# Altium footprint library PcbLib.PcbLib: 428 footprints (part 11 of 27)
Each footprint in its own frame and in the unit in brackets; x right, y up, seen from the top. Pads: shape width x height; smd on the part's side, far side on the other; paste and mask are expansions set on the pad; w line width, h text height; cw(c..) or ccw(c..) is an arc to the next point about the centre after c.
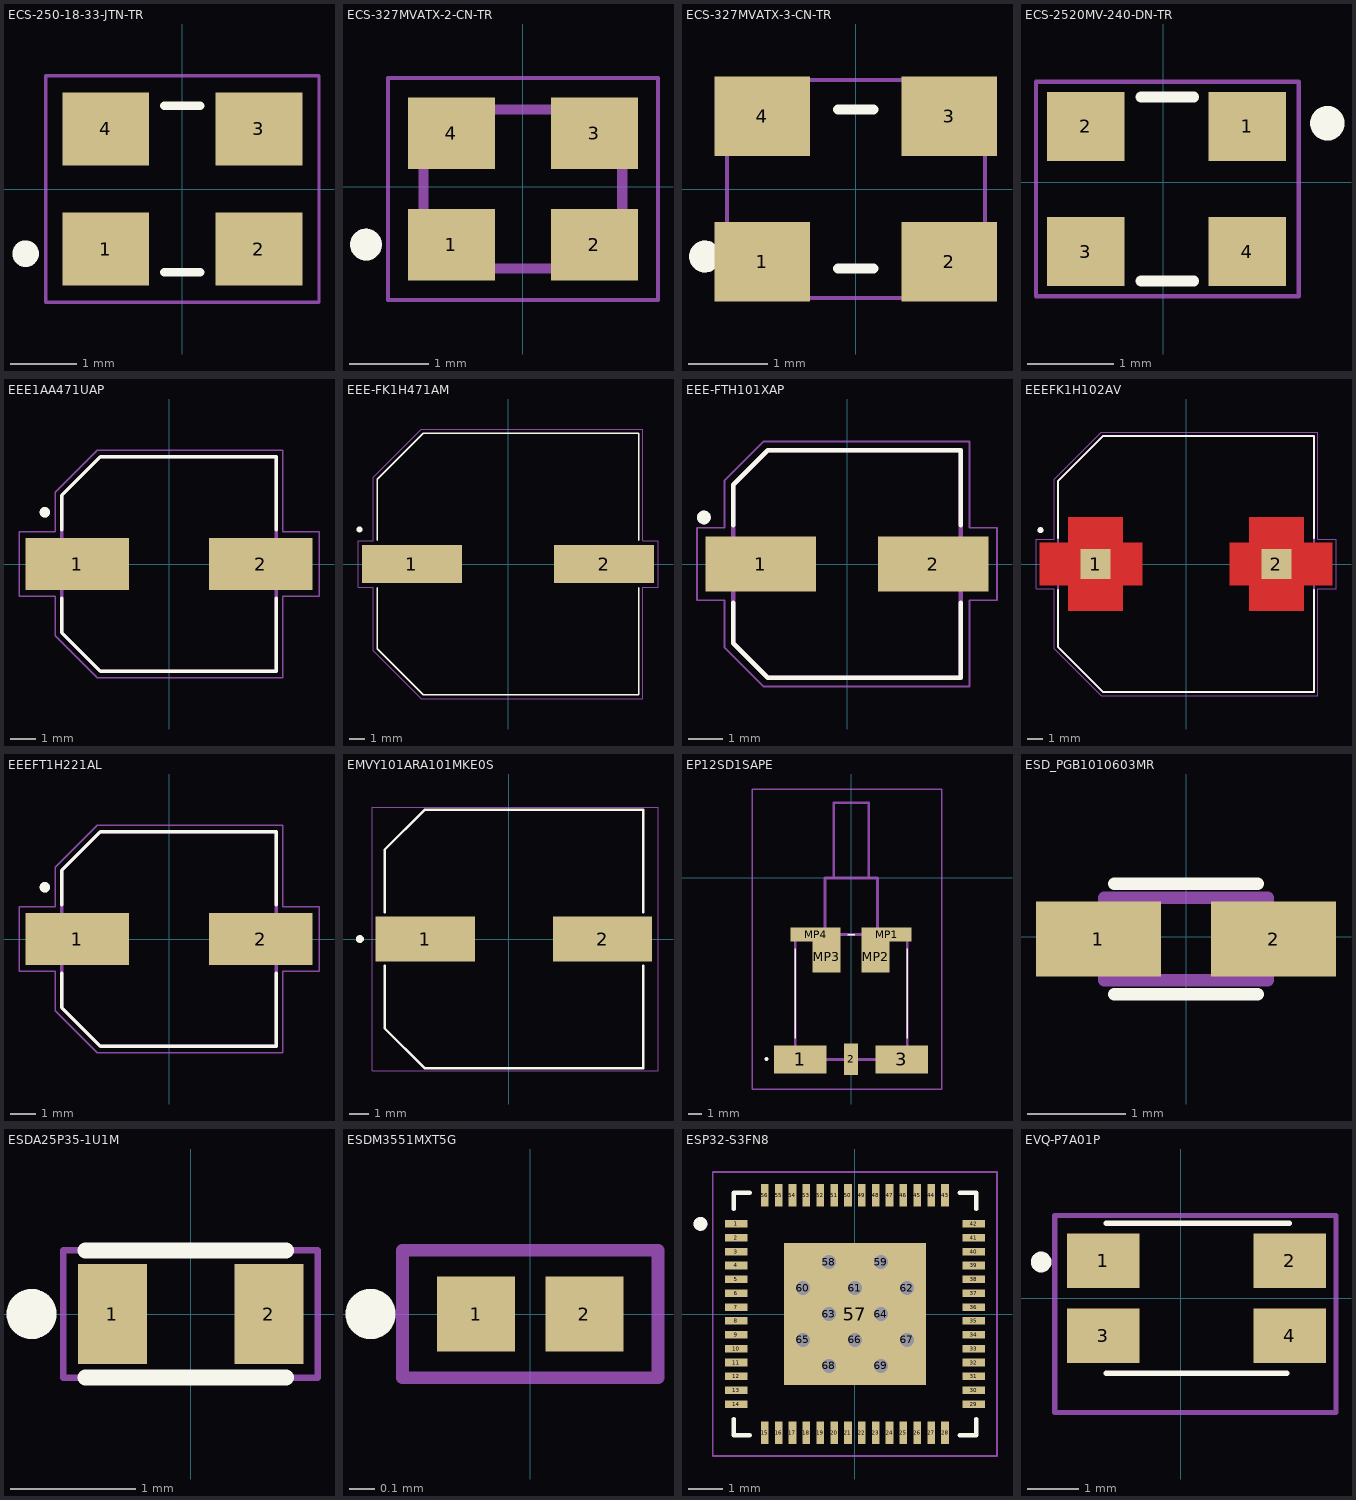
[diagram p10: the footprints below, top view; thin cyan lines are the x and y axes]

## ECS-250-18-33-JTN-TR [mm]
pads (4):
  rect 1.3x1.1 smd: 1(-1.15,-0.9) 2(1.15,-0.9) 3(1.15,0.9) 4(-1.15,0.9)
Top Overlay:
  circle w0.2: c-2.35,-0.97 r0.1
  lines w0.127: -0.27,-1.25 0.27,-1.25 ; -0.27,1.25 0.27,1.25
Mechanical 15:
  lines w0.05: -2.05,-1.7 2.05,-1.7 2.05,1.7 -2.05,1.7 -2.05,-1.7
3D body "step_temp.STEP": height 0.8, standoff 0, extent -1.6,-1.25 1.6,1.25

## ECS-327MVATX-2-CN-TR [mm]
pads (4):
  rect 1.1x0.9 smd: 1(-0.9,-0.725) 2(0.9,-0.725) 3(0.9,0.675) 4(-0.9,0.675)
Top Overlay:
  circle w0.2: c-1.977,-0.725 r0.1
Mechanical 13:
  circle w0.2: c-1.977,-0.725 r0.1
  lines w0.127: -1.25,-1.025 -1.25,0.975 1.25,0.975 1.25,-1.025 -1.25,-1.025
Mechanical 15:
  lines w0.05: -1.7,-1.425 -1.7,1.375 1.7,1.375 1.7,-1.425 -1.7,-1.425
3D body "ECS-2033-120-BN.STEP": height 1, standoff 0, extent -1.225,-1.025 1.275,0.975

## ECS-327MVATX-3-CN-TR [mm]
pads (4):
  rect 1.2x1 smd: 1(-1.179,-0.915) 2(1.179,-0.915) 3(1.179,0.915) 4(-1.179,0.915)
Top Overlay:
  circle w0.2: c-1.9,-0.85 r0.1
  lines w0.127: -0.221,-1 0.221,-1 ; -0.221,1 0.221,1
Mechanical 13:
  circle w0.2: c-1.9,-0.85 r0.1
Mechanical 15:
  lines w0.05: -1.625,-1.375 1.625,-1.375 1.625,1.375 -1.625,1.375 -1.625,-1.375
3D body "step_temp.STEP": height 1.2, standoff 0, extent -1.6,-1.25 1.6,1.25

## ECS-2520MV-240-DN-TR [mm]
height 0.8
pads (4):
  rect 0.9x0.8 smd: 1(0.974,0.649) 2(-0.898,0.649) 3(-0.898,-0.801) 4(0.974,-0.801)
Top Overlay:
  circle w0.2: c1.905,0.686 r0.1
  lines w0.127: -0.254,-1.143 0.356,-1.143 ; -0.254,0.991 0.356,0.991
Mechanical 15:
  lines w0.05: -1.473,-1.321 1.575,-1.321 1.575,1.168 -1.473,1.168 -1.473,-1.321
3D body "ASVTX-12-A-16.368MHZ-I15-T--3DModel-STEP-368357.STEP": height 0.95, standoff 0.05, extent -1.199,-1.076 1.301,0.924

## EEE1AA471UAP [mm]
pads (2):
  rect 4x2 smd: 1(-3.55,0) 2(3.55,0)
Top Overlay:
  circle w0.2: c-4.8,2 r0.1
  lines w0.127: -4.15,-1.32 -4.15,-2.65 -2.65,-4.15 4.15,-4.15 4.15,-1.32 ; -4.15,1.32 -4.15,2.65 -2.65,4.15 4.15,4.15 4.15,1.32
Mechanical 13:
  circle w0.2: c-4.8,2 r0.1
  lines w0.127: -4.15,-2.65 -4.15,2.65 -2.65,4.15 4.15,4.15 4.15,-4.15 -2.65,-4.15 -4.15,-2.65
Mechanical 15:
  lines w0.05: -5.8,-1.25 -4.4,-1.25 -4.4,-2.775 -2.775,-4.4 4.4,-4.4 4.4,-1.25 5.8,-1.25 5.8,1.25 4.4,1.25 4.4,4.4 -2.775,4.4 -4.4,2.775 -4.4,1.25 -5.8,1.25 -5.8,-1.25
3D body "step_temp.STEP": height 10.2, standoff 0, extent -4.85,-4.15 4.85,4.15

## EEE-FK1H471AM [mm] "EEE-FK1H471AM"
pads (2):
  rect 6.5x2.5 smd: 1(-6.25,0) 2(6.25,0)
Top Overlay:
  circle w0.2: c-9.65,2.25 r0.1
  lines w0.127: -8.5,-1.57 -8.5,-5.5 -5.5,-8.5 8.5,-8.5 8.5,-1.57 ; -8.5,1.57 -8.5,5.5 -5.5,8.5 8.5,8.5 8.5,1.57
Mechanical 15:
  lines w0.05: -9.75,-1.5 -9.75,1.5 -8.75,1.5 -8.75,5.625 -5.625,8.75 8.75,8.75 8.75,1.5 9.75,1.5 9.75,-1.5 8.75,-1.5 8.75,-8.75 -5.625,-8.75 -8.75,-5.625 -8.75,-1.5 -9.75,-1.5
3D body "step_temp.STEP": height 16.5, standoff 0, extent -9.2,-8.5 9.2,8.5

## EEE-FTH101XAP [mm]
pads (2):
  rect 3.2x1.6 smd: 1(-2.5,0) 2(2.5,0)
Top Overlay:
  circle w0.2: c-4.15,1.35 r0.1
  lines w0.127: -3.3,-1.12 -3.3,-2.3 -2.3,-3.3 3.3,-3.3 3.3,-1.12 ; -3.3,1.12 -3.3,2.3 -2.3,3.3 3.3,3.3 3.3,1.12
Mechanical 13:
  circle w0.2: c-4.15,1.35 r0.1
  lines w0.127: -3.3,-2.3 -2.3,-3.3 3.3,-3.3 3.3,3.3 -2.3,3.3 -3.3,2.3 -3.3,-2.3
Mechanical 15:
  lines w0.05: -4.35,-1.05 -4.35,1.05 -3.55,1.05 -3.55,2.425 -2.425,3.55 3.55,3.55 3.55,1.05 4.35,1.05 4.35,-1.05 3.55,-1.05 3.55,-3.55 -2.425,-3.55 -3.55,-2.425 -3.55,-1.05 -4.35,-1.05
3D body "step_temp.STEP": height 0, standoff 0, extent 0,0 0,0
3D body "EEE-FTH101XAP.STEP": height 7.7, standoff 0, extent -3.65,-3.3 3.65,3.3

## EEEFK1H102AV [mm]
pads (2):
  rect 2x2 smd paste-2 mask+0: 1(-6,0) 2(6,0)
Top Layer:
  region: -4.2,1.4 -2.9,1.4 -2.9,-1.4 -4.2,-1.4 -4.2,-3.1 -7.8,-3.1 -7.8,-1.4 -9.7,-1.4 -9.7,1.4 -7.8,1.4 -7.8,3.1 -4.2,3.1
  region: 7.8,1.4 9.7,1.4 9.7,-1.4 7.8,-1.4 7.8,-3.1 4.2,-3.1 4.2,-1.4 2.9,-1.4 2.9,1.4 4.2,1.4 4.2,3.1 7.8,3.1
Top Overlay:
  circle w0.2: c-9.65,2.25 r0.1
  lines w0.127: -8.5,-1.72 -8.5,-5.5 -5.5,-8.5 8.5,-8.5 8.5,-1.72 ; -8.5,1.72 -8.5,5.5 -5.5,8.5 8.5,8.5 8.5,1.72
Top Paste:
  region: -4.2,1.4 -2.9,1.4 -2.9,-1.4 -4.2,-1.4 -4.2,-3.1 -7.8,-3.1 -7.8,-1.4 -9.7,-1.4 -9.7,1.4 -7.8,1.4 -7.8,3.1 -4.2,3.1
  region: 7.8,1.4 9.7,1.4 9.7,-1.4 7.8,-1.4 7.8,-3.1 4.2,-3.1 4.2,-1.4 2.9,-1.4 2.9,1.4 4.2,1.4 4.2,3.1 7.8,3.1
Top Solder:
  region: -4.1,1.5 -2.8,1.5 -2.8,-1.5 -4.1,-1.5 -4.1,-3.2 -7.9,-3.2 -7.9,-1.5 -9.8,-1.5 -9.8,1.5 -7.9,1.5 -7.9,3.2 -4.1,3.2
  region: 7.9,1.5 9.8,1.5 9.8,-1.5 7.9,-1.5 7.9,-3.2 4.1,-3.2 4.1,-1.5 2.8,-1.5 2.8,1.5 4.1,1.5 4.1,3.2 7.9,3.2
Mechanical 13:
  circle w0.2: c-9.65,2.25 r0.1
  lines w0.127: -8.5,-5.5 -8.5,5.5 -5.5,8.5 8.5,8.5 8.5,-8.5 -5.5,-8.5 -8.5,-5.5
Mechanical 15:
  lines w0.05: -9.95,-1.65 -8.75,-1.65 -8.75,-5.625 -5.625,-8.75 8.75,-8.75 8.75,-1.65 9.95,-1.65 9.95,1.65 8.75,1.65 8.75,8.75 -5.625,8.75 -8.75,5.625 -8.75,1.65 -9.95,1.65 -9.95,-1.65
3D body "step_temp.STEP": height 16.8, standoff 0, extent -9.2,-8.5 9.2,8.5

## EEEFT1H221AL [mm]
pads (2):
  rect 4x2 smd: 1(-3.55,0) 2(3.55,0)
Top Overlay:
  circle w0.2: c-4.8,2 r0.1
  lines w0.127: -4.15,-1.32 -4.15,-2.65 -2.65,-4.15 4.15,-4.15 4.15,-1.32 ; -4.15,1.32 -4.15,2.65 -2.65,4.15 4.15,4.15 4.15,1.32
Mechanical 13:
  circle w0.2: c-4.8,2 r0.1
  lines w0.127: -4.15,-2.65 -2.65,-4.15 4.15,-4.15 4.15,4.15 -2.65,4.15 -4.15,2.65 -4.15,-2.65
Mechanical 15:
  lines w0.05: -5.8,-1.25 -5.8,1.25 -4.4,1.25 -4.4,2.775 -2.775,4.4 4.4,4.4 4.4,1.25 5.8,1.25 5.8,-1.25 4.4,-1.25 4.4,-4.4 -2.775,-4.4 -4.4,-2.775 -4.4,-1.25 -5.8,-1.25
3D body "step_temp.STEP": height 10.2, standoff 0, extent -4.85,-4.15 4.85,4.15

## EMVY101ARA101MKE0S [mil]
pads (2):
  rect 200x90 smd: 1(-168.31,0) 2(188.31,0)
Top Overlay:
  circle w7.87: c-300,0 r3.94
  lines w5: -250,-54.33 -250,-180 -170,-260 270,-260 270,-54.33 ; -250,54.33 -250,180 -170,260 270,260 270,54.33
Mechanical 15:
  lines w1.97: -275,-265 300,-265 300,265 -275,265 -275,-265
3D body "CHEMI-KE0.step": height 533.11, standoff 0, extent -259.49,-255.98 279.49,255.98

## EP12SD1SAPE [mm]
pads (7):
  rect 3.81x2.03 smd: 1(-3.685,-13.18) 3(3.685,-13.18)
  rect 1.02x2.29 smd: 2(0,-13.18)
  rect 3.63x1.02 smd: MP1(2.58,-4.11) MP4(-2.58,-4.11)
  rect 2.03x2.23 smd: MP2(1.78,-5.735) MP3(-1.78,-5.735)
Top Overlay:
  lines w0.1: -4.065,-11.645 -4.065,-5.145 -4.065,-11.645 ; -0.25,-4.11 0.25,-4.11 -0.25,-4.11 ; 4.065,-11.645 4.065,-5.145 4.065,-11.645
  lines w0.2: -6.2,-13.145 ccw(c-6.15,-13.145) -6.1,-13.145 ; -6.2,-13.145 cw(c-6.15,-13.145) -6.1,-13.145 ; -6.2,-13.145 ccw(c-6.15,-13.145) -6.1,-13.145
Mechanical 15:
  lines w0.1: -7.2,-15.325 6.59,-15.325 6.59,6.46 -7.2,6.46 -7.2,-15.325
  lines w0.2: -4.065,-13.18 -4.065,-4.11 4.065,-4.11 4.065,-13.18 -4.065,-13.18 ; -1.905,-4.11 -1.905,0 1.905,0 1.905,-4.11 -1.905,-4.11 ; -1.27,0 1.27,0 1.27,5.46 -1.27,5.46 -1.27,0
3D body "EP12SD1SAPE.stp": height 6.2, standoff -0.43, extent -5.11,-13.912 5.05,5.697

## ESD_PGB1010603MR [mm]
pads (2):
  rect 1.27x0.76 smd: 1(-0.89,-0.025) 2(0.89,-0.025)
Top Overlay:
  lines w0.127: -0.73,-0.585 0.73,-0.585 ; -0.73,0.535 0.73,0.535
Mechanical 13:
  lines w0.127: -0.83,-0.445 -0.83,0.395 0.83,0.395 0.83,-0.445 -0.83,-0.445
3D body "step_temp.STEP": height 0.43, standoff 0, extent -0.8,-0.432 0.8,0.381

## ESDA25P35-1U1M [mm]
pads (2):
  rect 0.55x0.8 smd paste-1: 1(-0.625,0) 2(0.625,0)
Top Overlay:
  circle w0.2: c-1.27,0 r0.1
  lines w0.127: -0.838,-0.508 0.762,-0.508 ; -0.838,0.508 0.762,0.508
Top Paste:
  region: 0.885,-0.38 0.365,-0.38 0.365,0.38 0.885,0.38
  region: -0.365,-0.38 -0.885,-0.38 -0.885,0.38 -0.365,0.38
Mechanical 15:
  lines w0.05: -1.016,-0.508 1.016,-0.508 1.016,0.508 -1.016,0.508 -1.016,-0.508
3D body "ESDA25P35-1U1M--3DModel-STEP-510211.STEP": height 0.6, standoff 0, extent -0.8,-0.5 0.8,0.5

## ESDM3551MXT5G [mm]
pads (2):
  rect 0.31x0.3 smd paste-0.016 mask+0.05: 1(-0.215,0) 2(0.215,0)
Top Overlay:
  circle w0.1: c-0.635,0 r0.05
Mechanical 15:
  lines w0.05: -0.508,-0.254 -0.508,0.254 0.508,0.254 0.508,-0.254 -0.508,-0.254
3D body "ESDM3551MXT5G--3DModel-STEP-56544.STEP": height 0.33, standoff 0, extent -0.31,-0.16 0.31,0.16

## ESP32-S3FN8 [mm]
height 0.9
pads (69):
  rect 0.65x0.22 smd mask+0.05: 1(-3.425,2.6) 2(-3.425,2.2) 3(-3.425,1.8) 4(-3.425,1.4) 5(-3.425,1) 6(-3.425,0.6) 7(-3.425,0.2) 8(-3.425,-0.2) 9(-3.425,-0.6) 10(-3.425,-1) 11(-3.425,-1.4) 12(-3.425,-1.8) 13(-3.425,-2.2) 14(-3.425,-2.6) 29(3.425,-2.6) 30(3.425,-2.2) 31(3.425,-1.8) 32(3.425,-1.4) 33(3.425,-1) 34(3.425,-0.6) 35(3.425,-0.2) 36(3.425,0.2) 37(3.425,0.6) 38(3.425,1) 39(3.425,1.4) 40(3.425,1.8) 41(3.425,2.2) 42(3.425,2.6)
  rect 0.22x0.65 smd mask+0.05: 15(-2.6,-3.425) 16(-2.2,-3.425) 17(-1.8,-3.425) 18(-1.4,-3.425) 19(-1,-3.425) 20(-0.6,-3.425) 21(-0.2,-3.425) 22(0.2,-3.425) 23(0.6,-3.425) 24(1,-3.425) 25(1.4,-3.425) 26(1.8,-3.425) 27(2.2,-3.425) 28(2.6,-3.425) 43(2.6,3.425) 44(2.2,3.425) 45(1.8,3.425) 46(1.4,3.425) 47(1,3.425) 48(0.6,3.425) 49(0.2,3.425) 50(-0.2,3.425) 51(-0.6,3.425) 52(-1,3.425) 53(-1.4,3.425) 54(-1.8,3.425) 55(-2.2,3.425) 56(-2.6,3.425)
  rect 4.1x4.1 smd paste-1.55: 57(0,0)
  round 0.5 hole 0.4 mask+0: 58(-0.75,1.5) 59(0.75,1.5) 60(-1.5,0.75) 61(0,0.75) 62(1.5,0.75) 63(-0.75,0) 64(0.75,0) 65(-1.5,-0.75) 66(0,-0.75) 67(1.5,-0.75) 68(-0.75,-1.5) 69(0.75,-1.5)
Top Overlay:
  circle w0.2: c-4.455,2.6 r0.1
  lines w0.127: -3.5,-3.03 -3.5,-3.5 -3.03,-3.5 ; -3.5,3.03 -3.5,3.5 -3.03,3.5 ; 3.03,-3.5 3.5,-3.5 3.5,-3.03 ; 3.03,3.5 3.5,3.5 3.5,3.03
Top Paste:
  region: 0.5,1 -0.5,1 -0.5,2 0.5,2
  region: 2,1 1,1 1,2 2,2
  region: 2,-0.5 1,-0.5 1,0.5 2,0.5
  region: 2,-2 1,-2 1,-1 2,-1
  region: 0.5,-2 -0.5,-2 -0.5,-1 0.5,-1
  region: -1,-2 -2,-2 -2,-1 -1,-1
  region: -1,-0.5 -2,-0.5 -2,0.5 -1,0.5
  region: -1,1 -2,1 -2,2 -1,2
Mechanical 13:
  circle w0.2: c-4.455,2.6 r0.1
Mechanical 15:
  lines w0.05: -4.1,-4.1 4.1,-4.1 4.1,4.1 -4.1,4.1 -4.1,-4.1
3D body "step_temp.STEP": height 0.9, standoff 0, extent -3.5,-3.5 3.5,3.5

## EVQ-P7A01P [mm]
pads (4):
  rect 1.4x1.05 smd: 1(-1.5,0.725) 2(2.1,0.725) 3(-1.5,-0.725) 4(2.1,-0.725)
Top Overlay:
  lines w0.1: -1.45,-1.45 2.05,-1.45 ; -1.45,1.45 2.1,1.45
  lines w0.2: -2.7,0.6 ccw(c-2.7,0.7) -2.7,0.8 ccw(c-2.7,0.7) -2.7,0.6
Mechanical 15:
  lines w0.1: -2.438,-2.21 2.997,-2.21 2.997,1.6 -2.438,1.6 -2.438,-2.21
3D body "EVQ-P7A01P.stp": height 1.36, standoff 0.01, extent -2.096,-2.128 2.604,1.422